# Altium schematic symbol library MiscPower.SchLib: 1552 symbols (part 6 of 22) (continued)
## LM3431QMH/NOPB
designator U?
3-Channel Constant Current LED Driver with Integrated Boost Controller, 28-pin TSSOP-EP, Pb-Free; PartNumber: LM3431QMH/NOPB; Manufacturer: National Semiconductor; PackageTopMarking: NSUZXYTTE#*LM3431*QMH; PowerWise: N; CompType: MiscPower; High-Reliability: Y; DatasheetVersion: Mar-2009; PackageVersion: revD, Oct-2003; PackageReference: MXA28A; PackageDescription: Molded TSSOP, Jedec, 9.7 x 4.4 x 0.9mm Body, 28 Lead, 0.65mm Pitch, Exposed Pad; RoHS: Y; PinCount: 28; Code_JEDEC: MO-153-AET; ComponentLink1Description: Manufacturer URL; ComponentLink1URL: http://www.national.com/; ComponentLink2Description: LM3431 Datasheet; ComponentLink2URL: http://www.national.com/ds/LM/LM3431.pdf; ComponentLink3Description: LM3431 Web Page; ComponentLink3URL: http://www.national.com/pf/LM/LM3431.html; ComponentLink4Description: MXA28A Package Page; ComponentLink4URL: http://www.national.com/packaging/folders/mxa28a.html
footprint MXA28A_N (TSOP, 28-Leads, Body 9.7x4.4mm, Pitch 0.65mm, Thermal Pad, IPC Medium Density)
footprint MXA28A_L (TSOP, 28-Leads, Body 9.7x4.4mm, Pitch 0.65mm, Thermal Pad, IPC High Density)
footprint MXA28A_M (TSOP, 28-Leads, Body 9.7x4.4mm, Pitch 0.65mm, Thermal Pad, IPC Low Density)
pins: 1 VIN (power), 2 PGND (power), 3 VCC (power), 4 LG (out), 5 CS (in), 6 ILIM (in), 7 MODE/F (in), 8 FF, 9 RT (in), 10 REF (out), 11 REFIN (in), 12 COMP, 13 SGND (power), 14 AFB (in), 15 SS/SH (in), 16 DLY (in), 17 CFB (in), 18 SC (in), 19 LEDOFF, 20 SNS3 (in), 21 NDRV3 (out), 22 SNS2 (in), 23 NDRV2 (out), 24 SNS1 (in), 25 NDRV1 (out), 26 THM (in), 27 DIM (in), 28 EN (in), 29 DAP (power)

## LM3431QMHX/NOPB
designator U?
3-Channel Constant Current LED Driver with Integrated Boost Controller, 28-pin TSSOP-EP, Pb-Free; PartNumber: LM3431QMHX/NOPB; Manufacturer: National Semiconductor; PackageTopMarking: NSUZXYTTE#*LM3431*QMH; PowerWise: N; CompType: MiscPower; High-Reliability: Y; DatasheetVersion: Mar-2009; PackageVersion: revD, Oct-2003; PackageReference: MXA28A; PackageDescription: Molded TSSOP, Jedec, 9.7 x 4.4 x 0.9mm Body, 28 Lead, 0.65mm Pitch, Exposed Pad; RoHS: Y; PinCount: 28; Code_JEDEC: MO-153-AET; ComponentLink1Description: Manufacturer URL; ComponentLink1URL: http://www.national.com/; ComponentLink2Description: LM3431 Datasheet; ComponentLink2URL: http://www.national.com/ds/LM/LM3431.pdf; ComponentLink3Description: LM3431 Web Page; ComponentLink3URL: http://www.national.com/pf/LM/LM3431.html; ComponentLink4Description: MXA28A Package Page; ComponentLink4URL: http://www.national.com/packaging/folders/mxa28a.html
footprint MXA28A_N (TSOP, 28-Leads, Body 9.7x4.4mm, Pitch 0.65mm, Thermal Pad, IPC Medium Density)
footprint MXA28A_L (TSOP, 28-Leads, Body 9.7x4.4mm, Pitch 0.65mm, Thermal Pad, IPC High Density)
footprint MXA28A_M (TSOP, 28-Leads, Body 9.7x4.4mm, Pitch 0.65mm, Thermal Pad, IPC Low Density)
pins: 1 VIN (power), 2 PGND (power), 3 VCC (power), 4 LG (out), 5 CS (in), 6 ILIM (in), 7 MODE/F (in), 8 FF, 9 RT (in), 10 REF (out), 11 REFIN (in), 12 COMP, 13 SGND (power), 14 AFB (in), 15 SS/SH (in), 16 DLY (in), 17 CFB (in), 18 SC (in), 19 LEDOFF, 20 SNS3 (in), 21 NDRV3 (out), 22 SNS2 (in), 23 NDRV2 (out), 24 SNS1 (in), 25 NDRV1 (out), 26 THM (in), 27 DIM (in), 28 EN (in), 29 DAP (power)

## LM3432BSQ/NOPB
designator U?
6-Channel Current Regulator for LED Backlight Application, 24-pin LLP, Pb-Free; PartNumber: LM3432BSQ/NOPB; Manufacturer: National Semiconductor; PackageTopMarking: NS*UZXYTT*3432BSQ; PowerWise: N; CompType: MiscPower; High-Reliability: Y; DatasheetVersion: May-2008; PackageVersion: revA, Oct-2003; PackageReference: SQA24B; PackageDescription: LLP, Plastic, Quad, 5 x 4 x 0.8mm Body, 24 Lead, 0.5mm Pitch, No Pullback; RoHS: Y; PinCount: 24; Code_JEDEC: MO-220-WGHD-1; ComponentLink1Description: Manufacturer URL; ComponentLink1URL: http://www.national.com/; ComponentLink2Description: LM3432B Datasheet; ComponentLink2URL: http://www.national.com/ds/LM/LM3432B.pdf; ComponentLink3Description: LM3432B Web Page; ComponentLink3URL: http://www.national.com/pf/LM/LM3432B.html; ComponentLink4Description: SQA24B Package Page; ComponentLink4URL: http://www.national.com/packaging/folders/sqa24b.html
footprint SQA24B (QFN, 24-Leads, Body 5x4mm, Pitch 0.5mm, NSC Recommended)
pins: 1 VCC (power), 2 IREF (in), 3 AGND (power), 4 CDHC, 5 VDHC (out), 6 EN (in), 7 MODE (in), 8 DIM, 9 FAULTb (oc), 10 OTMb (oc), 11 NC, 12 IOUT6 (oc), 13 IOUT5 (oc), 14 NC, 15 IOUT4 (oc), 16 NC, 17 IOUT3 (oc), 18 NC, 19 IOUT2 (oc), 20 IOUT1 (oc), 21 NC, 22 PGND (power), 23 NC, 24 VIN (power), 25 EP (power)

## LM3432BSQE/NOPB
designator U?
6-Channel Current Regulator for LED Backlight Application, 24-pin LLP, Pb-Free; PartNumber: LM3432BSQE/NOPB; Manufacturer: National Semiconductor; PackageTopMarking: NS*UZXYTT*3432BSQ; PowerWise: N; CompType: MiscPower; High-Reliability: Y; DatasheetVersion: May-2008; PackageVersion: revA, Oct-2003; PackageReference: SQA24B; PackageDescription: LLP, Plastic, Quad, 5 x 4 x 0.8mm Body, 24 Lead, 0.5mm Pitch, No Pullback; RoHS: Y; PinCount: 24; Code_JEDEC: MO-220-WGHD-1; ComponentLink1Description: Manufacturer URL; ComponentLink1URL: http://www.national.com/; ComponentLink2Description: LM3432B Datasheet; ComponentLink2URL: http://www.national.com/ds/LM/LM3432.pdf; ComponentLink3Description: LM3432B Web Page; ComponentLink3URL: http://www.national.com/pf/LM/LM3432B.html; ComponentLink4Description: SQA24B Package Page; ComponentLink4URL: http://www.national.com/packaging/folders/sqa24b.html
footprint SQA24B (QFN, 24-Leads, Body 5x4mm, Pitch 0.5mm, NSC Recommended)
pins: 1 VCC (power), 2 IREF (in), 3 AGND (power), 4 CDHC, 5 VDHC (out), 6 EN (in), 7 MODE (in), 8 DIM, 9 FAULTb (oc), 10 OTMb (oc), 11 NC, 12 IOUT6 (oc), 13 IOUT5 (oc), 14 NC, 15 IOUT4 (oc), 16 NC, 17 IOUT3 (oc), 18 NC, 19 IOUT2 (oc), 20 IOUT1 (oc), 21 NC, 22 PGND (power), 23 NC, 24 VIN (power), 25 EP (power)

## LM3432BSQX/NOPB
designator U?
6-Channel Current Regulator for LED Backlight Application, 24-pin LLP, Pb-Free; PartNumber: LM3432BSQX/NOPB; Manufacturer: National Semiconductor; PackageTopMarking: NS*UZXYTT*3432BSQ; PowerWise: N; CompType: MiscPower; High-Reliability: Y; DatasheetVersion: May-2008; PackageVersion: revA, Oct-2003; PackageReference: SQA24B; PackageDescription: LLP, Plastic, Quad, 5 x 4 x 0.8mm Body, 24 Lead, 0.5mm Pitch, No Pullback; RoHS: Y; PinCount: 24; Code_JEDEC: MO-220-WGHD-1; ComponentLink1Description: Manufacturer URL; ComponentLink1URL: http://www.national.com/; ComponentLink2Description: LM3432B Datasheet; ComponentLink2URL: http://www.national.com/ds/LM/LM3432B.pdf; ComponentLink3Description: LM3432B Web Page; ComponentLink3URL: http://www.national.com/pf/LM/LM3432B.html; ComponentLink4Description: SQA24B Package Page; ComponentLink4URL: http://www.national.com/packaging/folders/sqa24b.html
footprint SQA24B (QFN, 24-Leads, Body 5x4mm, Pitch 0.5mm, NSC Recommended)
pins: 1 VCC (power), 2 IREF (in), 3 AGND (power), 4 CDHC, 5 VDHC (out), 6 EN (in), 7 MODE (in), 8 DIM, 9 FAULTb (oc), 10 OTMb (oc), 11 NC, 12 IOUT1 (oc), 13 IOUT2 (oc), 14 NC, 15 IOUT3 (oc), 16 NC, 17 IOUT4 (oc), 18 NC, 19 IOUT5 (oc), 20 IOUT6 (oc), 21 NC, 22 PGND (power), 23 NC, 24 VIN (power), 25 EP (power)

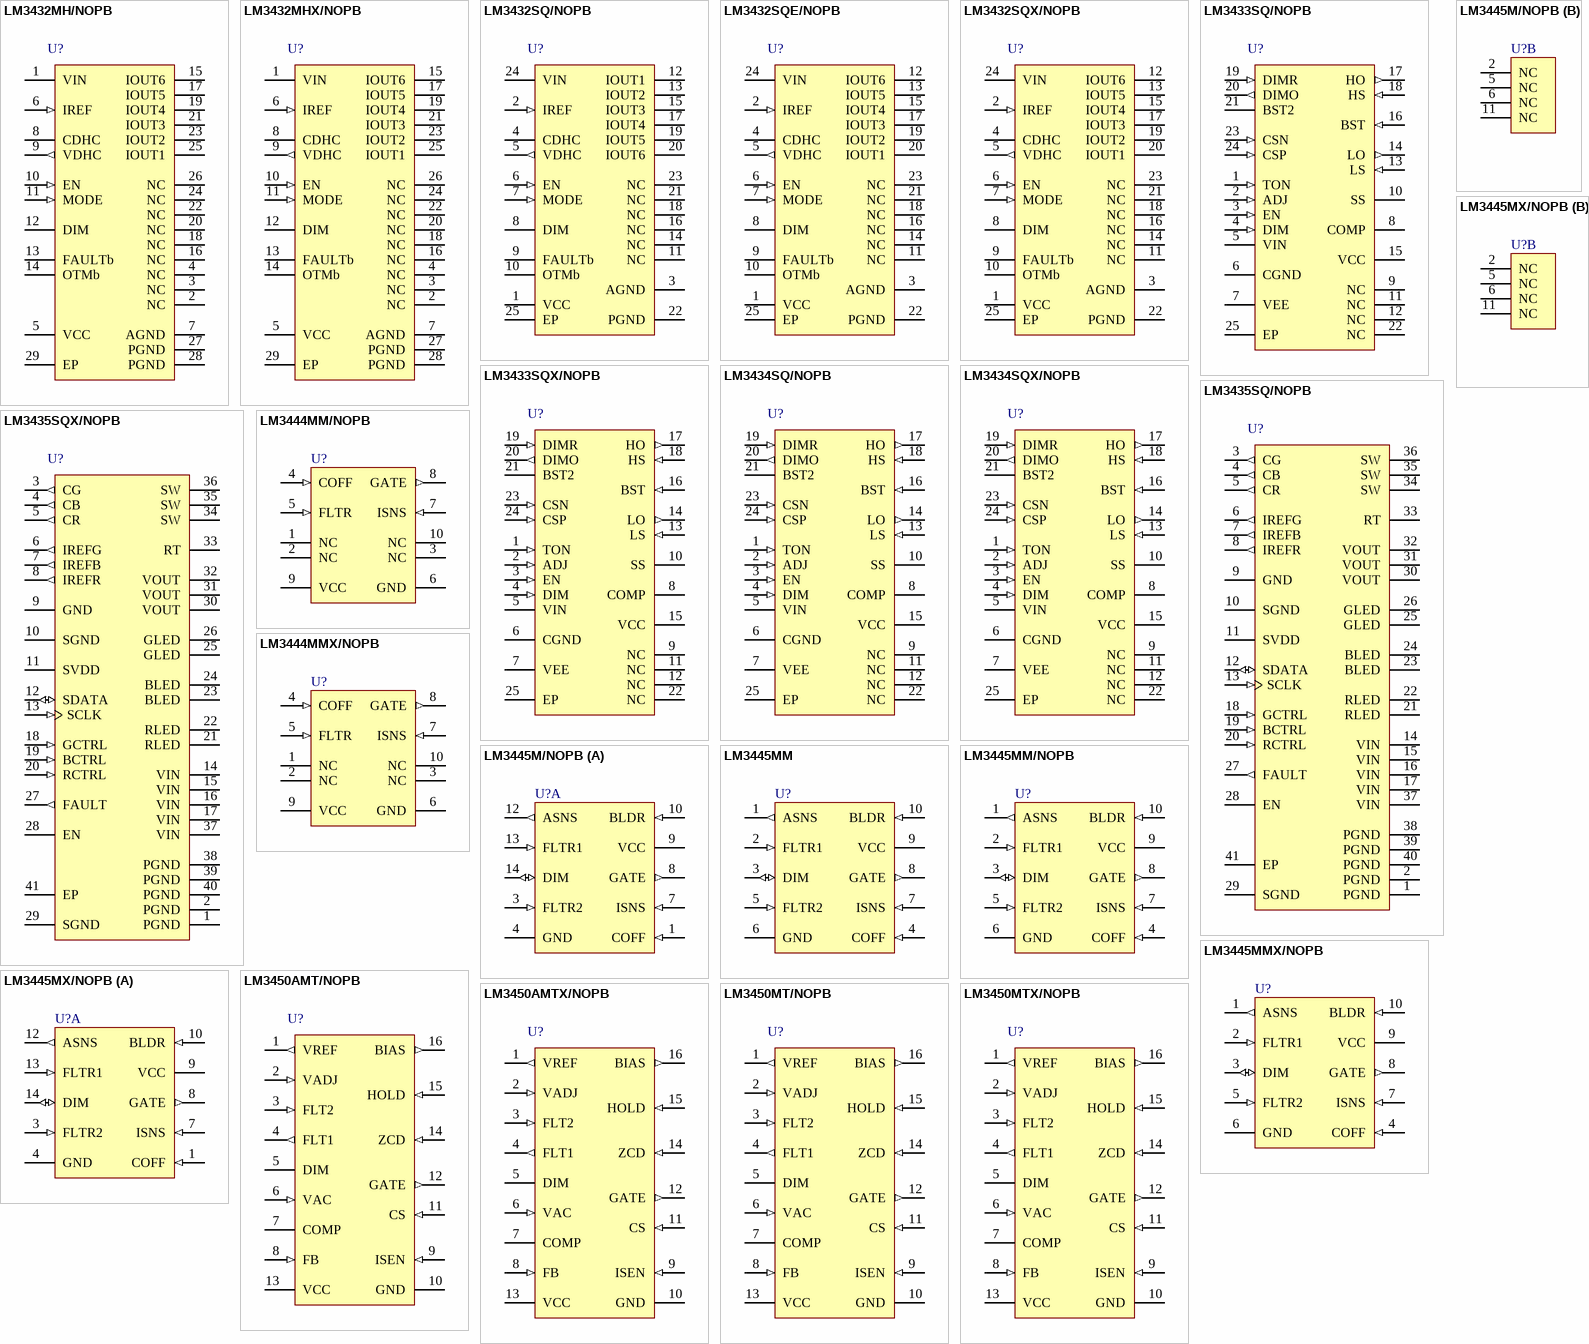
[diagram p13: symbols LM3432MH/NOPB to LM3450MTX/NOPB]

## LM3432MH/NOPB
designator U?
6-Channel Current Regulator for LED Backlight Application, 28-pin TSSOP-EP, Pb-Free; PartNumber: LM3432MH/NOPB; Manufacturer: National Semiconductor; PackageTopMarking: NSUZXYTTE#*LM3432*MH; PowerWise: N; CompType: MiscPower; High-Reliability: Y; DatasheetVersion: May-2008; PackageVersion: revD, Oct-2003; PackageReference: MXA28A; PackageDescription: Molded TSSOP, Jedec, 9.7 x 4.4 x 0.9mm Body, 28 Lead, 0.65mm Pitch, Exposed Pad; RoHS: Y; PinCount: 28; Code_JEDEC: MO-153-AET; ComponentLink1Description: Manufacturer URL; ComponentLink1URL: http://www.national.com/; ComponentLink2Description: LM3432 Datasheet; ComponentLink2URL: http://www.national.com/ds/LM/LM3432.pdf; ComponentLink3Description: LM3432 Web Page; ComponentLink3URL: http://www.national.com/pf/LM/LM3432.html; ComponentLink4Description: MXA28A Package Page; ComponentLink4URL: http://www.national.com/packaging/folders/mxa28a.html
footprint MXA28A_N (TSOP, 28-Leads, Body 9.7x4.4mm, Pitch 0.65mm, Thermal Pad, IPC Medium Density)
footprint MXA28A_L (TSOP, 28-Leads, Body 9.7x4.4mm, Pitch 0.65mm, Thermal Pad, IPC High Density)
footprint MXA28A_M (TSOP, 28-Leads, Body 9.7x4.4mm, Pitch 0.65mm, Thermal Pad, IPC Low Density)
pins: 1 VIN (power), 2 NC, 3 NC, 4 NC, 5 VCC (power), 6 IREF (in), 7 AGND (power), 8 CDHC, 9 VDHC (out), 10 EN (in), 11 MODE (in), 12 DIM, 13 FAULTb (oc), 14 OTMb (oc), 15 IOUT6 (oc), 16 NC, 17 IOUT5 (oc), 18 NC, 19 IOUT4 (oc), 20 NC, 21 IOUT3 (oc), 22 NC, 23 IOUT2 (oc), 24 NC, 25 IOUT1 (oc), 26 NC, 27 PGND (power), 28 PGND (power), 29 EP (power)

## LM3432MHX/NOPB
designator U?
6-Channel Current Regulator for LED Backlight Application, 28-pin TSSOP-EP, Pb-Free; PartNumber: LM3432MHX/NOPB; Manufacturer: National Semiconductor; PackageTopMarking: NSUZXYTTE#*LM3432*MH; PowerWise: N; CompType: MiscPower; High-Reliability: Y; DatasheetVersion: May-2008; PackageVersion: revD, Oct-2003; PackageReference: MXA28A; PackageDescription: Molded TSSOP, Jedec, 9.7 x 4.4 x 0.9mm Body, 28 Lead, 0.65mm Pitch, Exposed Pad; RoHS: Y; PinCount: 28; Code_JEDEC: MO-153-AET; ComponentLink1Description: Manufacturer URL; ComponentLink1URL: http://www.national.com/; ComponentLink2Description: LM3432 Datasheet; ComponentLink2URL: http://www.national.com/ds/LM/LM3432.pdf; ComponentLink3Description: LM3432 Web Page; ComponentLink3URL: http://www.national.com/pf/LM/LM3432.html; ComponentLink4Description: MXA28A Package Page; ComponentLink4URL: http://www.national.com/packaging/folders/mxa28a.html
footprint MXA28A_N (TSOP, 28-Leads, Body 9.7x4.4mm, Pitch 0.65mm, Thermal Pad, IPC Medium Density)
footprint MXA28A_L (TSOP, 28-Leads, Body 9.7x4.4mm, Pitch 0.65mm, Thermal Pad, IPC High Density)
footprint MXA28A_M (TSOP, 28-Leads, Body 9.7x4.4mm, Pitch 0.65mm, Thermal Pad, IPC Low Density)
pins: 1 VIN (power), 2 NC, 3 NC, 4 NC, 5 VCC (power), 6 IREF (in), 7 AGND (power), 8 CDHC, 9 VDHC (out), 10 EN (in), 11 MODE (in), 12 DIM, 13 FAULTb (oc), 14 OTMb (oc), 15 IOUT6 (oc), 16 NC, 17 IOUT5 (oc), 18 NC, 19 IOUT4 (oc), 20 NC, 21 IOUT3 (oc), 22 NC, 23 IOUT2 (oc), 24 NC, 25 IOUT1 (oc), 26 NC, 27 PGND (power), 28 PGND (power), 29 EP (power)

## LM3432SQ/NOPB
designator U?
6-Channel Current Regulator for LED Backlight Application, 24-pin LLP, Pb-Free; PartNumber: LM3432SQ/NOPB; Manufacturer: National Semiconductor; PackageTopMarking: NS*UZXYTT*L3432SQ; PowerWise: N; CompType: MiscPower; High-Reliability: Y; DatasheetVersion: May-2008; PackageVersion: revA, Oct-2003; PackageReference: SQA24B; PackageDescription: LLP, Plastic, Quad, 5 x 4 x 0.8mm Body, 24 Lead, 0.5mm Pitch, No Pullback; RoHS: Y; PinCount: 24; Code_JEDEC: MO-220-WGHD-1; ComponentLink1Description: Manufacturer URL; ComponentLink1URL: http://www.national.com/; ComponentLink2Description: LM3432 Datasheet; ComponentLink2URL: http://www.national.com/ds/LM/LM3432.pdf; ComponentLink3Description: LM3432 Web Page; ComponentLink3URL: http://www.national.com/pf/LM/LM3432.html; ComponentLink4Description: SQA24B Package Page; ComponentLink4URL: http://www.national.com/packaging/folders/sqa24b.html
footprint SQA24B (QFN, 24-Leads, Body 5x4mm, Pitch 0.5mm, NSC Recommended)
pins: 1 VCC (power), 2 IREF (in), 3 AGND (power), 4 CDHC, 5 VDHC (out), 6 EN (in), 7 MODE (in), 8 DIM, 9 FAULTb (oc), 10 OTMb (oc), 11 NC, 12 IOUT1 (oc), 13 IOUT2 (oc), 14 NC, 15 IOUT3 (oc), 16 NC, 17 IOUT4 (oc), 18 NC, 19 IOUT5 (oc), 20 IOUT6 (oc), 21 NC, 22 PGND (power), 23 NC, 24 VIN (power), 25 EP (power)

## LM3432SQE/NOPB
designator U?
6-Channel Current Regulator for LED Backlight Application, 24-pin LLP, Pb-Free; PartNumber: LM3432SQE/NOPB; Manufacturer: National Semiconductor; PackageTopMarking: NS*UZXYTT*L3432SQ; PowerWise: N; CompType: MiscPower; High-Reliability: Y; DatasheetVersion: May-2008; PackageVersion: revA, Oct-2003; PackageReference: SQA24B; PackageDescription: LLP, Plastic, Quad, 5 x 4 x 0.8mm Body, 24 Lead, 0.5mm Pitch, No Pullback; RoHS: Y; PinCount: 24; Code_JEDEC: MO-220-WGHD-1; ComponentLink1Description: Manufacturer URL; ComponentLink1URL: http://www.national.com/; ComponentLink2Description: LM3432 Datasheet; ComponentLink2URL: http://www.national.com/ds/LM/LM3432.pdf; ComponentLink3Description: LM3432 Web Page; ComponentLink3URL: http://www.national.com/pf/LM/LM3432.html; ComponentLink4Description: SQA24B Package Page; ComponentLink4URL: http://www.national.com/packaging/folders/sqa24b.html
footprint SQA24B (QFN, 24-Leads, Body 5x4mm, Pitch 0.5mm, NSC Recommended)
pins: 1 VCC (power), 2 IREF (in), 3 AGND (power), 4 CDHC, 5 VDHC (out), 6 EN (in), 7 MODE (in), 8 DIM, 9 FAULTb (oc), 10 OTMb (oc), 11 NC, 12 IOUT6 (oc), 13 IOUT5 (oc), 14 NC, 15 IOUT4 (oc), 16 NC, 17 IOUT3 (oc), 18 NC, 19 IOUT2 (oc), 20 IOUT1 (oc), 21 NC, 22 PGND (power), 23 NC, 24 VIN (power), 25 EP (power)

## LM3432SQX/NOPB
designator U?
6-Channel Current Regulator for LED Backlight Application, 24-pin LLP, Pb-Free; PartNumber: LM3432SQX/NOPB; Manufacturer: National Semiconductor; PackageTopMarking: NS*UZXYTT*L3432SQ; PowerWise: N; CompType: MiscPower; High-Reliability: Y; DatasheetVersion: May-2008; PackageVersion: revA, Oct-2003; PackageReference: SQA24B; PackageDescription: LLP, Plastic, Quad, 5 x 4 x 0.8mm Body, 24 Lead, 0.5mm Pitch, No Pullback; RoHS: Y; PinCount: 24; Code_JEDEC: MO-220-WGHD-1; ComponentLink1Description: Manufacturer URL; ComponentLink1URL: http://www.national.com/; ComponentLink2Description: LM3432 Datasheet; ComponentLink2URL: http://www.national.com/ds/LM/LM3432.pdf; ComponentLink3Description: LM3432 Web Page; ComponentLink3URL: http://www.national.com/pf/LM/LM3432.html; ComponentLink4Description: SQA24B Package Page; ComponentLink4URL: http://www.national.com/packaging/folders/sqa24b.html
footprint SQA24B (QFN, 24-Leads, Body 5x4mm, Pitch 0.5mm, NSC Recommended)
pins: 1 VCC (power), 2 IREF (in), 3 AGND (power), 4 CDHC, 5 VDHC (out), 6 EN (in), 7 MODE (in), 8 DIM, 9 FAULTb (oc), 10 OTMb (oc), 11 NC, 12 IOUT6 (oc), 13 IOUT5 (oc), 14 NC, 15 IOUT4 (oc), 16 NC, 17 IOUT3 (oc), 18 NC, 19 IOUT2 (oc), 20 IOUT1 (oc), 21 NC, 22 PGND (power), 23 NC, 24 VIN (power), 25 EP (power)

## LM3433SQ/NOPB
designator U?
Common Anode Capable High Brightness LED Driver with High Frequency Dimming, 24-pin LLP, Pb-Free; PartNumber: LM3433SQ/NOPB; Manufacturer: National Semiconductor; PackageTopMarking: NS*UZXYTT*L3433SQ; PowerWise: Y; CompType: MiscPower; DatasheetVersion: Mar-2008; PackageVersion: revB, Aug-2003; PackageReference: SQA24A; PackageDescription: LLP, Plastic, Quad, 4 x 4 x 0.8mm Body, 24 Lead, 0.5mm Pitch, No Pullback; RoHS: Y; PinCount: 24; High-Reliability: Y; Code_JEDEC: MO-220-WGGD-6; ComponentLink1Description: Manufacturer URL; ComponentLink1URL: http://www.national.com/; ComponentLink2Description: LM3433 Datasheet; ComponentLink2URL: http://www.national.com/ds/LM/LM3433.pdf; ComponentLink3Description: LM3433 Web Page; ComponentLink3URL: http://www.national.com/pf/LM/LM3433.html; ComponentLink4Description: SQA24A Package Page; ComponentLink4URL: http://www.national.com/packaging/folders/sqa24a.html
footprint SQA24A (QFN, 24-Leads, Body 4x4mm, Pitch 0.5mm, Thermal Pad 2.7x2.7mm, NSC Recommended)
pins: 1 TON (in), 2 ADJ (in), 3 EN (in), 4 DIM (in), 5 VIN (power), 6 CGND (power), 7 VEE (power), 8 COMP, 9 NC, 10 SS, 11 NC, 12 NC, 13 LS (in), 14 LO (out), 15 VCC (power), 16 BST (in), 17 HO (out), 18 HS (in), 19 DIMR (in), 20 DIMO (out), 21 BST2, 22 NC, 23 CSN (in), 24 CSP (in), 25 EP (power)

## LM3433SQX/NOPB
designator U?
Common Anode Capable High Brightness LED Driver with High Frequency Dimming, 24-pin LLP, Pb-Free; PartNumber: LM3433SQX/NOPB; Manufacturer: National Semiconductor; PackageTopMarking: NS*UZXYTT*L3433SQ; PowerWise: Y; CompType: MiscPower; DatasheetVersion: Mar-2008; PackageVersion: revB, Aug-2003; PackageReference: SQA24A; PackageDescription: LLP, Plastic, Quad, 4 x 4 x 0.8mm Body, 24 Lead, 0.5mm Pitch, No Pullback; RoHS: Y; PinCount: 24; High-Reliability: Y; Code_JEDEC: MO-220-WGGD-6; ComponentLink1Description: Manufacturer URL; ComponentLink1URL: http://www.national.com/; ComponentLink2Description: LM3433 Datasheet; ComponentLink2URL: http://www.national.com/ds/LM/LM3433.pdf; ComponentLink3Description: LM3433 Web Page; ComponentLink3URL: http://www.national.com/pf/LM/LM3433.html; ComponentLink4Description: SQA24A Package Page; ComponentLink4URL: http://www.national.com/packaging/folders/sqa24a.html
footprint SQA24A (QFN, 24-Leads, Body 4x4mm, Pitch 0.5mm, Thermal Pad 2.7x2.7mm, NSC Recommended)
pins: 1 TON (in), 2 ADJ (in), 3 EN (in), 4 DIM (in), 5 VIN (power), 6 CGND (power), 7 VEE (power), 8 COMP, 9 NC, 10 SS, 11 NC, 12 NC, 13 LS (in), 14 LO (out), 15 VCC (power), 16 BST (in), 17 HO (out), 18 HS (in), 19 DIMR (in), 20 DIMO (out), 21 BST2, 22 NC, 23 CSN (in), 24 CSP (in), 25 EP (power)

## LM3434SQ/NOPB
designator U?
Common Anode Capable High Brightness LED Driver with High Frequency Dimming, 24 pin LLP; PartNumber: LM3434SQ/NOPB; Manufacturer: National Semiconductor; PackageTopMarking: NS*UZXYTT*L3434; PowerWise: Y; CompType: MiscPower; DatasheetVersion: Aug-2010; PackageVersion: revB, Aug-2003; PackageReference: SQA24A; PackageDescription: LLP, Plastic, Quad, 4 x 4 x 0.8mm Body, 24 Lead, 0.5mm Pitch, No Pullback; RoHS: Y; PinCount: 24; High-Reliability: Y; Code_JEDEC: MO-220-WGGD-6; ComponentLink1Description: Manufacturer URL; ComponentLink1URL: http://www.national.com/; ComponentLink2Description: LM3434 Datasheet; ComponentLink2URL: http://www.national.com/ds/LM/LM3434.pdf; ComponentLink3Description: LM3434 Web Page; ComponentLink3URL: http://www.national.com/pf/LM/LM3434.html; ComponentLink4Description: SQA24A Package Page; ComponentLink4URL: http://www.national.com/packaging/folders/sqa24a.html
footprint SQA24A (QFN, 24-Leads, Body 4x4mm, Pitch 0.5mm, Thermal Pad 2.7x2.7mm, NSC Recommended)
pins: 1 TON (in), 2 ADJ (in), 3 EN (in), 4 DIM (in), 5 VIN (power), 6 CGND (power), 7 VEE (power), 8 COMP, 9 NC, 10 SS, 11 NC, 12 NC, 13 LS (in), 14 LO (out), 15 VCC (power), 16 BST (in), 17 HO (out), 18 HS (in), 19 DIMR (in), 20 DIMO (out), 21 BST2, 22 NC, 23 CSN (in), 24 CSP (in), 25 EP (power)

## LM3434SQX/NOPB
designator U?
Common Anode Capable High Brightness LED Driver with High Frequency Dimming, 24 pin LLP; PartNumber: LM3434SQX/NOPB; Manufacturer: National Semiconductor; PackageTopMarking: NS*UZXYTT*L3434; PowerWise: Y; CompType: MiscPower; DatasheetVersion: Aug-2010; PackageVersion: revB, Aug-2003; PackageReference: SQA24A; PackageDescription: LLP, Plastic, Quad, 4 x 4 x 0.8mm Body, 24 Lead, 0.5mm Pitch, No Pullback; RoHS: Y; PinCount: 24; High-Reliability: Y; Code_JEDEC: MO-220-WGGD-6; ComponentLink1Description: Manufacturer URL; ComponentLink1URL: http://www.national.com/; ComponentLink2Description: LM3434 Datasheet; ComponentLink2URL: http://www.national.com/ds/LM/LM3434.pdf; ComponentLink3Description: LM3434 Web Page; ComponentLink3URL: http://www.national.com/pf/LM/LM3434.html; ComponentLink4Description: SQA24A Package Page; ComponentLink4URL: http://www.national.com/packaging/folders/sqa24a.html
footprint SQA24A (QFN, 24-Leads, Body 4x4mm, Pitch 0.5mm, Thermal Pad 2.7x2.7mm, NSC Recommended)
pins: 1 TON (in), 2 ADJ (in), 3 EN (in), 4 DIM (in), 5 VIN (power), 6 CGND (power), 7 VEE (power), 8 COMP, 9 NC, 10 SS, 11 NC, 12 NC, 13 LS (in), 14 LO (out), 15 VCC (power), 16 BST (in), 17 HO (out), 18 HS (in), 19 DIMR (in), 20 DIMO (out), 21 BST2, 22 NC, 23 CSN (in), 24 CSP (in), 25 EP (power)

## LM3435SQ/NOPB
designator U?
Compact Sequential Mode RGB LED Driver with I2C Control Interface, 40-pin LLP, Pb-Free; PartNumber: LM3435SQ/NOPB; Manufacturer: National Semiconductor; PackageTopMarking: NS*>U>Z>2>X>E*L3435SQ; PowerWise: Y; CompType: MiscPower; DatasheetVersion: Oct-2011; PackageVersion: revB, Jul-2004; PackageReference: SQF40A; PackageDescription: LLP, Quad, 5 x 5 x 0.8mm Body, 40 Lead, 0.4mm Pitch, 3.6 x 3.6mm Exposed Pad; RoHS: Y; PinCount: 40; High-Reliability: Y; ComponentLink1Description: Manufacturer URL; ComponentLink1URL: http://www.national.com/; ComponentLink2Description: LM3435 Datasheet; ComponentLink2URL: http://www.national.com/ds/LM/LM3435.pdf; ComponentLink3Description: LM3435 Web Page; ComponentLink3URL: http://www.national.com/pf/LM/LM3435.html; ComponentLink4Description: SQF40A Package Page; ComponentLink4URL: http://www.national.com/packaging/folders/sqf40a.html
footprint SQF40A (QFN, 41-Leads, Body 5x5mm, Pitch 0.4mm, Thermal Pad 3.6x3.6mm, NSC Recommended)
pins: 1 PGND (power), 2 PGND (power), 3 CG (out), 4 CB (out), 5 CR (out), 6 IREFG (out), 7 IREFB (out), 8 IREFR (out), 9 GND (power), 10 SGND (power), 11 SVDD (power), 12 SDATA (io), 13 SCLK (in), 14 VIN (power), 15 VIN (power), 16 VIN (power), 17 VIN (power), 18 GCTRL (in), 19 BCTRL (in), 20 RCTRL (in), 21 RLED (oc), 22 RLED (oc), 23 BLED (oc), 24 BLED (oc), 25 GLED (oc), 26 GLED (oc), 27 FAULT (out), 28 EN, 29 SGND (power), 30 VOUT (hiz), 31 VOUT (hiz), 32 VOUT (hiz), 33 RT (hiz), 34 SW (power), 35 SW (power), 36 SW (power), 37 VIN (power), 38 PGND (power), 39 PGND (power), 40 PGND (power), 41 EP (power)

## LM3435SQX/NOPB
designator U?
Compact Sequential Mode RGB LED Driver with I2C Control Interface, 40-pin LLP, Pb-Free; PartNumber: LM3435SQX/NOPB; Manufacturer: National Semiconductor; PackageTopMarking: NS*>U>Z>2>X>E*L3435SQ; PowerWise: Y; CompType: MiscPower; DatasheetVersion: Oct-2011; PackageVersion: revB, Jul-2004; PackageReference: SQF40A; PackageDescription: LLP, Quad, 5 x 5 x 0.8mm Body, 40 Lead, 0.4mm Pitch, 3.6 x 3.6mm Exposed Pad; RoHS: Y; PinCount: 40; High-Reliability: Y; ComponentLink1Description: Manufacturer URL; ComponentLink1URL: http://www.national.com/; ComponentLink2Description: LM3435 Datasheet; ComponentLink2URL: http://www.national.com/ds/LM/LM3435.pdf; ComponentLink3Description: LM3435 Web Page; ComponentLink3URL: http://www.national.com/pf/LM/LM3435.html; ComponentLink4Description: SQF40A Package Page; ComponentLink4URL: http://www.national.com/packaging/folders/sqf40a.html
footprint SQF40A (QFN, 41-Leads, Body 5x5mm, Pitch 0.4mm, Thermal Pad 3.6x3.6mm, NSC Recommended)
pins: 1 PGND (power), 2 PGND (power), 3 CG (out), 4 CB (out), 5 CR (out), 6 IREFG (out), 7 IREFB (out), 8 IREFR (out), 9 GND (power), 10 SGND (power), 11 SVDD (power), 12 SDATA (io), 13 SCLK (in), 14 VIN (power), 15 VIN (power), 16 VIN (power), 17 VIN (power), 18 GCTRL (in), 19 BCTRL (in), 20 RCTRL (in), 21 RLED (oc), 22 RLED (oc), 23 BLED (oc), 24 BLED (oc), 25 GLED (oc), 26 GLED (oc), 27 FAULT (out), 28 EN, 29 SGND (power), 30 VOUT (hiz), 31 VOUT (hiz), 32 VOUT (hiz), 33 RT (hiz), 34 SW (power), 35 SW (power), 36 SW (power), 37 VIN (power), 38 PGND (power), 39 PGND (power), 40 PGND (power), 41 EP (power)

## LM3444MM/NOPB
designator U?
AC-DC Offline LED Driver, 10-pin Mini SOIC, 1000 Reel; PartNumber: LM3444MM/NOPB; Manufacturer: National Semiconductor; PackageTopMarking: ZXTT*SZTB; PowerWise: Y; CompType: MiscPower; DatasheetVersion: Jan-2011; PackageVersion: revB, Jul-2003; PackageReference: MUB10A; PackageDescription: Mini-SO, Molded, .118 x .118 x .034in Body, 10 Lead, .0197in Pitch; RoHS: Y; PinCount: 10; High-Reliability: Y; Code_JEDEC: MO-187-BA; ComponentLink1Description: Manufacturer URL; ComponentLink1URL: http://www.national.com/; ComponentLink2Description: LM3444 Datasheet; ComponentLink2URL: http://www.national.com/ds/LM/LM3444.pdf; ComponentLink3Description: LM3444 Web Page; ComponentLink3URL: http://www.national.com/pf/LM/LM3444.html; ComponentLink4Description: MUB10A Package Page; ComponentLink4URL: http://www.national.com/packaging/folders/mub10a.html
footprint MUB10A_N (TSSOP, 10-Leads, Body 3x3mm, Pitch 0.5mm, IPC Medium Density)
footprint MUB10A_L (TSSOP, 10-Leads, Body 3x3mm, Pitch 0.5mm, IPC High Density)
footprint MUB10A_M (TSSOP, 10-Leads, Body 3x3mm, Pitch 0.5mm, IPC Low Density)
pins: 1 NC, 2 NC, 3 NC, 4 COFF (in), 5 FLTR (in), 6 GND (power), 7 ISNS (in), 8 GATE (out), 9 VCC (power), 10 NC